# Altium footprint library 风扇_V1.1.PcbLib: 18 footprints (part 2 of 2)
Each footprint in its own frame and in the unit in brackets; x right, y up, seen from the top. Pads: shape width x height; smd on the part's side, far side on the other; paste and mask are expansions set on the pad; w line width, h text height; cw(c..) or ccw(c..) is an arc to the next point about the centre after c.
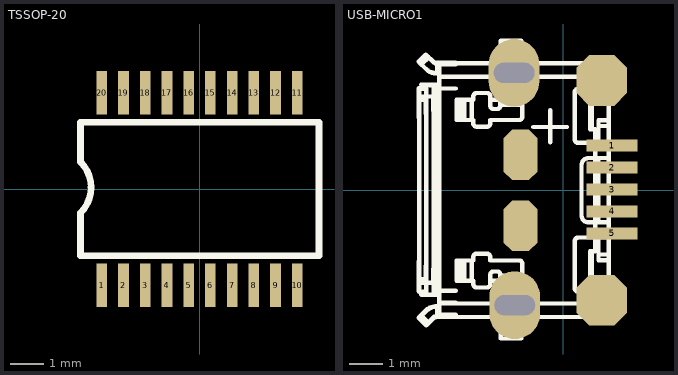
[diagram p1: the footprints below, top view; thin cyan lines are the x and y axes]

## TSSOP-20 [mm]
pads (20):
  rect 0.32x1.3 smd: 1(-2.925,-2.875) 2(-2.275,-2.875) 3(-1.625,-2.875) 4(-0.975,-2.875) 5(-0.325,-2.875) 6(0.325,-2.875) 7(0.975,-2.875) 8(1.625,-2.875) 9(2.275,-2.875) 10(2.925,-2.875) 11(2.925,2.875) 12(2.275,2.875) 13(1.625,2.875) 14(0.975,2.875) 15(0.325,2.875) 16(-0.325,2.875) 17(-0.975,2.875) 18(-1.625,2.875) 19(-2.275,2.875) 20(-2.925,2.875)
Top Overlay:
  lines w0.2: -3.56,-2 3.575,-2 3.575,2 -3.56,2 -3.56,0.811 cw(c-4.322,0.048) -3.56,-0.715 -3.56,-1.968

## USB-MICRO1 [mm]
height 0.8
pads (11):
  rect 1.5x0.35 smd: 1(1.448,1.325) 2(1.448,0.675) 3(1.448,0.025) 4(1.448,-0.625) 5(1.448,-1.275)
  oval 1.5x2 hole 0.6 slot 1.2 at 0 deg: ""(-1.448,3.474) ""(-1.428,-3.394)
  oct 1x1.5 smd: ""(-1.258,-1.05) ""(-1.258,1.05)
  oct 1.5x1.5 smd: ""(1.142,-3.25) ""(1.142,3.25)
Top Overlay:
  drawing of 224 lines, arcs and shapes, not listed